# Altium footprint library WARG.PcbLib: 73 footprints (part 5 of 5)
Each footprint in its own frame and in the unit in brackets; x right, y up, seen from the top. Pads: shape width x height; smd on the part's side, far side on the other; paste and mask are expansions set on the pad; w line width, h text height; cw(c..) or ccw(c..) is an arc to the next point about the centre after c.
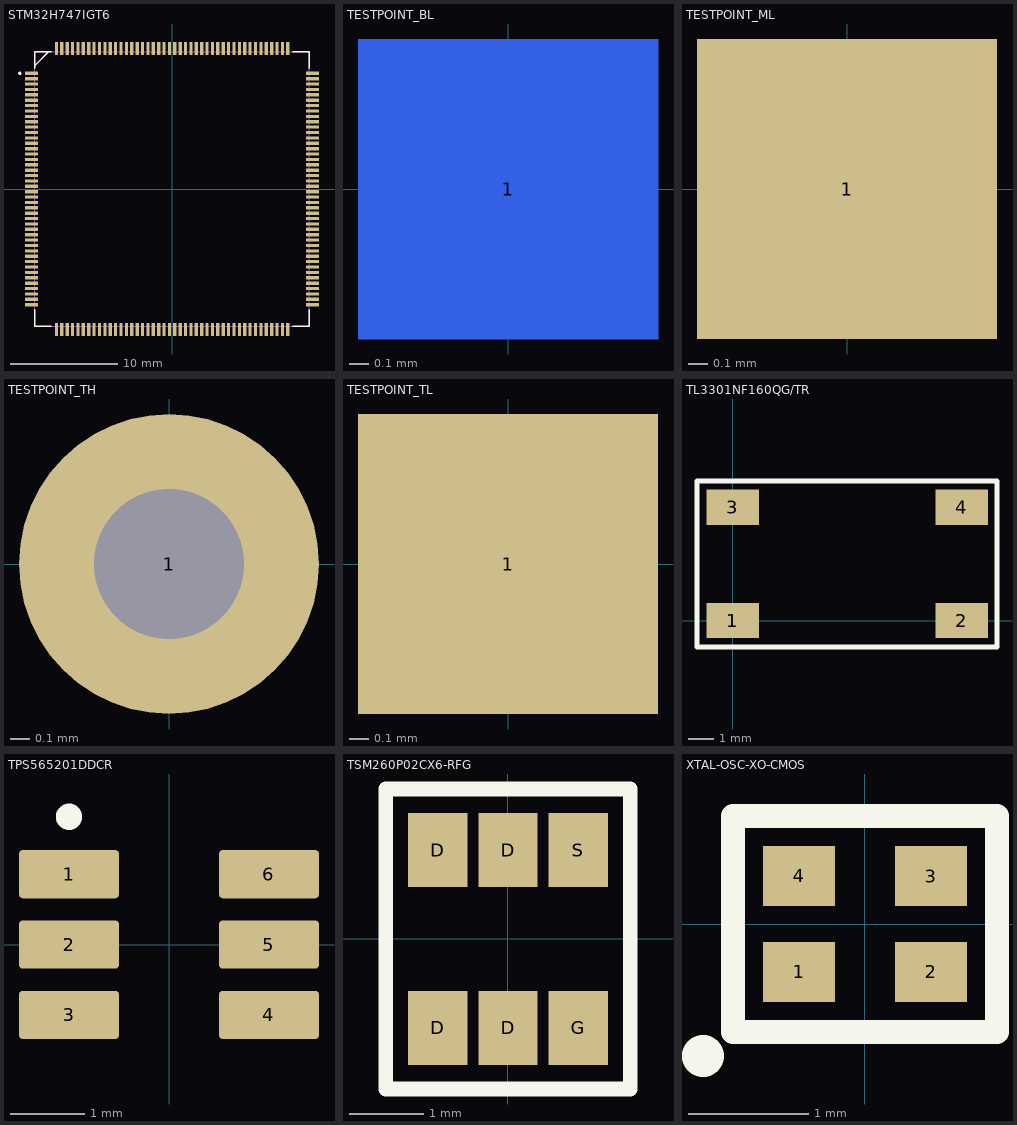
[diagram p4: the footprints below, top view; thin cyan lines are the x and y axes]

## STM32H747IGT6 [mm]
pads (176):
  rect 1.2x0.3 smd: 1(-13.05,10.75) 2(-13.05,10.25) 3(-13.05,9.75) 4(-13.05,9.25) 5(-13.05,8.75) 6(-13.05,8.25) 7(-13.05,7.75) 8(-13.05,7.25) 9(-13.05,6.75) 10(-13.05,6.25) 11(-13.05,5.75) 12(-13.05,5.25) 13(-13.05,4.75) 14(-13.05,4.25) 15(-13.05,3.75) 16(-13.05,3.25) 17(-13.05,2.75) 18(-13.05,2.25) 19(-13.05,1.75) 20(-13.05,1.25) 21(-13.05,0.75) 22(-13.05,0.25) 23(-13.05,-0.25) 24(-13.05,-0.75) 25(-13.05,-1.25) 26(-13.05,-1.75) 27(-13.05,-2.25) 28(-13.05,-2.75) 29(-13.05,-3.25) 30(-13.05,-3.75) 31(-13.05,-4.25) 32(-13.05,-4.75) 33(-13.05,-5.25) 34(-13.05,-5.75) 35(-13.05,-6.25) 36(-13.05,-6.75) 37(-13.05,-7.25) 38(-13.05,-7.75) 39(-13.05,-8.25) 40(-13.05,-8.75) 41(-13.05,-9.25) 42(-13.05,-9.75) 43(-13.05,-10.25) 44(-13.05,-10.75) 89(13.05,-10.75) 90(13.05,-10.25) 91(13.05,-9.75) 92(13.05,-9.25) 93(13.05,-8.75) 94(13.05,-8.25) 95(13.05,-7.75) 96(13.05,-7.25) 97(13.05,-6.75) 98(13.05,-6.25) 99(13.05,-5.75) 100(13.05,-5.25) 101(13.05,-4.75) 102(13.05,-4.25) 103(13.05,-3.75) 104(13.05,-3.25) 105(13.05,-2.75) 106(13.05,-2.25) 107(13.05,-1.75) 108(13.05,-1.25) 109(13.05,-0.75) 110(13.05,-0.25) 111(13.05,0.25) 112(13.05,0.75) 113(13.05,1.25) 114(13.05,1.75) 115(13.05,2.25) 116(13.05,2.75) 117(13.05,3.25) 118(13.05,3.75) 119(13.05,4.25) 120(13.05,4.75) 121(13.05,5.25) 122(13.05,5.75) 123(13.05,6.25) 124(13.05,6.75) 125(13.05,7.25) 126(13.05,7.75) 127(13.05,8.25) 128(13.05,8.75) 129(13.05,9.25) 130(13.05,9.75) 131(13.05,10.25) 132(13.05,10.75)
  rect 0.3x1.2 smd: 45(-10.75,-13.05) 46(-10.25,-13.05) 47(-9.75,-13.05) 48(-9.25,-13.05) 49(-8.75,-13.05) 50(-8.25,-13.05) 51(-7.75,-13.05) 52(-7.25,-13.05) 53(-6.75,-13.05) 54(-6.25,-13.05) 55(-5.75,-13.05) 56(-5.25,-13.05) 57(-4.75,-13.05) 58(-4.25,-13.05) 59(-3.75,-13.05) 60(-3.25,-13.05) 61(-2.75,-13.05) 62(-2.25,-13.05) 63(-1.75,-13.05) 64(-1.25,-13.05) 65(-0.75,-13.05) 66(-0.25,-13.05) 67(0.25,-13.05) 68(0.75,-13.05) 69(1.25,-13.05) 70(1.75,-13.05) 71(2.25,-13.05) 72(2.75,-13.05) 73(3.25,-13.05) 74(3.75,-13.05) 75(4.25,-13.05) 76(4.75,-13.05) 77(5.25,-13.05) 78(5.75,-13.05) 79(6.25,-13.05) 80(6.75,-13.05) 81(7.25,-13.05) 82(7.75,-13.05) 83(8.25,-13.05) 84(8.75,-13.05) 85(9.25,-13.05) 86(9.75,-13.05) 87(10.25,-13.05) 88(10.75,-13.05) 133(10.75,13.05) 134(10.25,13.05) 135(9.75,13.05) 136(9.25,13.05) 137(8.75,13.05) 138(8.25,13.05) 139(7.75,13.05) 140(7.25,13.05) 141(6.75,13.05) 142(6.25,13.05) 143(5.75,13.05) 144(5.25,13.05) 145(4.75,13.05) 146(4.25,13.05) 147(3.75,13.05) 148(3.25,13.05) 149(2.75,13.05) 150(2.25,13.05) 151(1.75,13.05) 152(1.25,13.05) 153(0.75,13.05) 154(0.25,13.05) 155(-0.25,13.05) 156(-0.75,13.05) 157(-1.25,13.05) 158(-1.75,13.05) 159(-2.25,13.05) 160(-2.75,13.05) 161(-3.25,13.05) 162(-3.75,13.05) 163(-4.25,13.05) 164(-4.75,13.05) 165(-5.25,13.05) 166(-5.75,13.05) 167(-6.25,13.05) 168(-6.75,13.05) 169(-7.25,13.05) 170(-7.75,13.05) 171(-8.25,13.05) 172(-8.75,13.05) 173(-9.25,13.05) 174(-9.75,13.05) 175(-10.25,13.05) 176(-10.75,13.05)
Top Overlay:
  circle w0.152: c-14.154,10.75 r0.076
  lines w0.152: -12.75,-11.233 -12.75,-12.75 -11.233,-12.75 ; -12.75,11.233 -12.75,12.75 -11.233,12.75 ; -12.75,11.48 -11.48,12.75 ; 11.233,-12.75 12.75,-12.75 12.75,-11.233 ; 11.233,12.75 12.75,12.75 12.75,11.233
Mechanical 7:
Mechanical 13:
  circle w0: c-14.154,10.75 r0.076
  lines w0.025: -12.75,11.48 -11.48,12.75 ; -12.75,-12.75 12.75,-12.75 12.75,12.75 -12.75,12.75 -12.75,-12.75
3D body "LQFP-176.step": height 1.65, standoff 0, extent -13.3,-13.3 13.3,13.3
3D body: height 0.25, standoff 0, extent 0,0 0.254,0.254

## TESTPOINT_BL [mil] "Test Point on the Bottom Layer of the PCB"
pads (1):
  rect 60x60 smd far side: 1(0,0)

## TESTPOINT_ML [mil] "Multi-layer Test Point"
pads (1):
  rect 60x60 all layers, no hole: 1(0,0)

## TESTPOINT_TH [mil] "Through-hole Test Point"
pads (1):
  round 60 hole 30: 1(0,0)

## TESTPOINT_TL [mil] "Test Point on the Top Layer of the PCB"
pads (1):
  rect 60x60 smd: 1(0,0)

## TL3301NF160QG/TR [mm]
pads (4):
  rect 2.1x1.4 smd: 1(0,0) 2(9.1,0) 3(0,4.5) 4(9.1,4.5)
Top Overlay:
  lines w0.2: -1.42,-1.06 1.34,-1.06 1.69,-1.06 7.34,-1.06 9.865,-1.06 10.5,-1.06 10.5,1.725 10.5,4.225 10.5,5.55 10.125,5.55 7.65,5.55 1.65,5.55 -0.824,5.55 -1.121,5.55 -1.42,5.55 -1.42,-0.355 -1.42,-1.06
3D body "TL3301NFxxxxG.stp": height 4.41, standoff 0.01, extent -0.5,-0.7 9.5,5.3

## TPS565201DDCR [mm] "IC REG BUCK ADJ 5A TSOT23-6"
height 1.1
pads (6):
  rrect15% 1.35x0.65 smd mask+0.102: 1(-1.35,0.95) 2(-1.35,0) 3(-1.35,-0.95) 4(1.35,-0.95) 5(1.35,0) 6(1.35,0.95)
Top Overlay:
  circle w0.254: c-1.35,1.725 r0.05
3D body "SOT-23-6.step": height 1.45, standoff 0, extent -1.4,-1.45 1.4,1.45

## TSM260P02CX6-RFG [mm]
pads (6):
  rect 0.8x1 smd mask+0.051: D(-0.95,-1.2) D(-0.95,1.2) D(0,-1.2) D(0,1.2) G(0.95,-1.2) S(0.95,1.2)
Top Overlay:
  lines w0.2: -1.65,-0.45 -1.65,2.025 1.65,2.025 1.65,-2.025 -1.65,-2.025 -1.65,0.5
3D body "User Library-SOT-23-6.step": height 1.09, standoff 0, extent -1.397,-1.226 1.397,1.2

## XTAL-OSC-XO-CMOS [mm] "Footprint for XTAL OSC XO 25.0000MHZ CMOS SMD"
pads (4):
  rect 0.6x0.5 smd: 1(-0.55,-0.4) 2(0.55,-0.4) 3(0.55,0.4) 4(-0.55,0.4)
Top Overlay:
  circle w0.25: c-1.35,-1.1 r0.05
  lines w0.2: -1.1,-0.9 1.1,-0.9 1.1,0.9 -1.1,0.9 -1.1,-0.9
3D body "ASCO.STEP": height 0.61, standoff 0.01, extent -0.8,-0.6 0.8,0.6